# Altium footprint library 3.22-杂项.PcbLib: 985 footprints (part 16 of 64)
Each footprint in its own frame and in the unit in brackets; x right, y up, seen from the top. Pads: shape width x height; smd on the part's side, far side on the other; paste and mask are expansions set on the pad; w line width, h text height; cw(c..) or ccw(c..) is an arc to the next point about the centre after c.
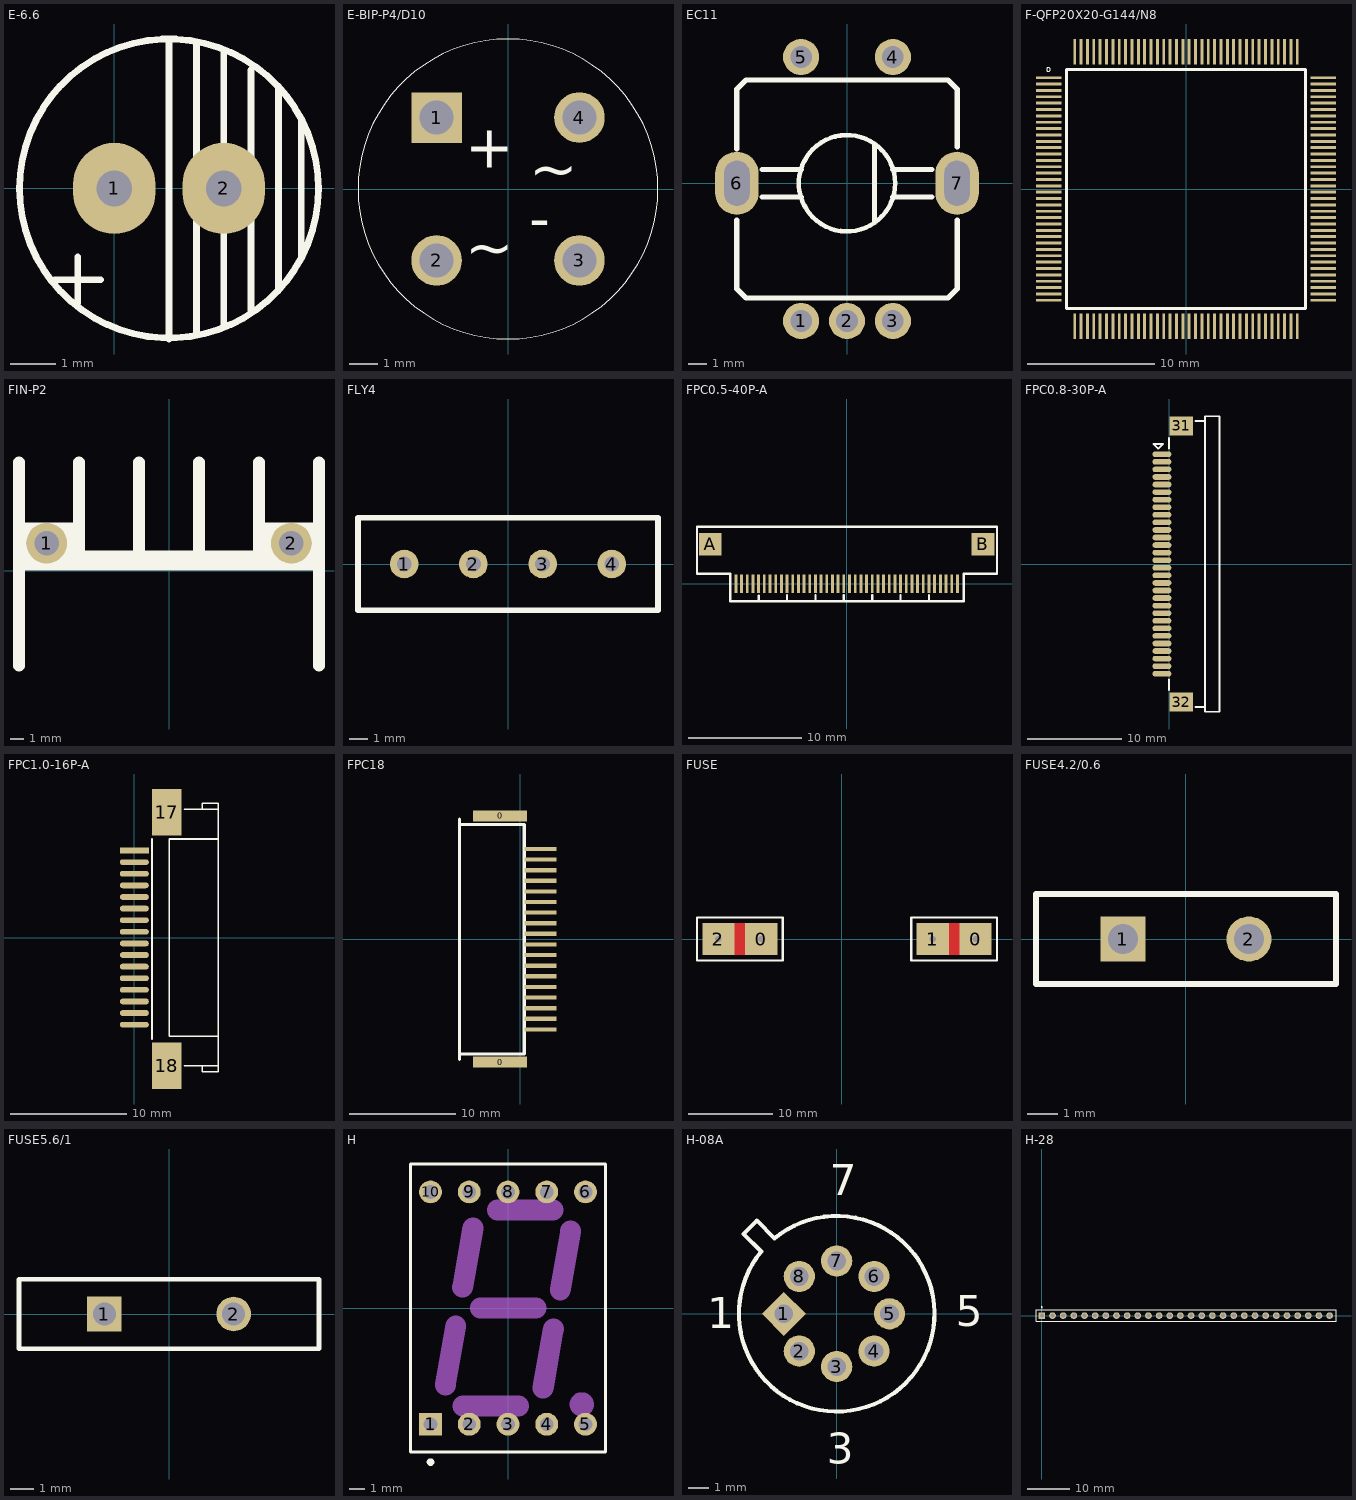
[diagram p15: the footprints below, top view; thin cyan lines are the x and y axes]

## E-6.6 [mm] "100uF/50V"
pads (2):
  oval 1.8x2 hole 0.787: 1(0,0) 2(2.4,0)
Top Overlay:
  circle w0.15: c1.2,0 r3.277
  lines w0.15: -1.3,-2 -0.3,-2 ; -0.8,-2.5 -0.8,-1.5 ; 1.2,-3.3 1.2,3.2 ; 1.8,-3.2 1.8,3.2 ; 2.4,-3 2.4,3 ; 3,-2.7 3,2.6 ; 3.6,-2.2 3.6,2.2 ; 4.1,-1.5 4.1,1.5

## E-BIP-P4/D10 [mm] "整流桥　xy=5.08"
pads (4):
  rect 1.8x1.8 hole 1.2: 1(-2.54,2.54)
  round 1.8 hole 1.2: 2(-2.54,-2.54) 3(2.54,-2.54) 4(2.54,2.54)
Top Overlay:
  circle w0.025: c0,0 r5.334
  text "~" at 0.762,0 h1.5
  text "~" at -1.524,-2.794 h1.5
  text "+" at -1.524,0.762 h1.5
  text "-" at 0.762,-1.778 h1.5

## EC11 [mm]
pads (7):
  round 2 hole 1.2: 1(-2.54,-7.62) 2(0,-7.62) 3(2.54,-7.62) 4(2.54,6.985) 5(-2.54,6.985)
  oval 2.4x3.5 hole 1.4 slot 2.5 at 90 deg: 6(-6.096,0) 7(6.096,0)
Top Overlay:
  circle w0.254: c0,0 r2.667
  lines w0.3: -6.096,-2.032 -6.096,-5.842 -5.588,-6.35 5.588,-6.35 6.096,-5.842 6.096,-2.032 ; -6.096,1.905 -6.096,5.207 -5.588,5.715 5.588,5.715 6.096,5.207 6.096,2.032 ; -4.699,-0.762 -2.54,-0.762 ; -4.699,0.762 -2.54,0.762 ; 1.524,-2.159 1.524,2.159 ; 2.54,-0.762 4.699,-0.762 ; 2.54,0.762 4.699,0.762

## F-QFP20X20-G144/N8 [mm] "dsp2407海堂的"
pads (144):
  rect 2x0.229 smd: 1(-10.795,8.75) 2(-10.795,8.25) 3(-10.795,7.75) 4(-10.795,7.25) 5(-10.795,6.75) 6(-10.795,6.25) 7(-10.795,5.75) 8(-10.795,5.25) 9(-10.795,4.75) 10(-10.795,4.25) 11(-10.795,3.75) 12(-10.795,3.25) 13(-10.795,2.75) 14(-10.795,2.25) 15(-10.795,1.75) 16(-10.795,1.25) 17(-10.795,0.75) 18(-10.795,0.25) 19(-10.795,-0.25) 20(-10.795,-0.75) 21(-10.795,-1.25) 22(-10.795,-1.75) 23(-10.795,-2.25) 24(-10.795,-2.75) 25(-10.795,-3.25) 26(-10.795,-3.75) 27(-10.795,-4.25) 28(-10.795,-4.75) 29(-10.795,-5.25) 30(-10.795,-5.75) 31(-10.795,-6.25) 32(-10.795,-6.75) 33(-10.795,-7.25) 34(-10.795,-7.75) 35(-10.795,-8.25) 36(-10.795,-8.75) 73(10.795,-8.75) 74(10.795,-8.25) 75(10.795,-7.75) 76(10.795,-7.25) 77(10.795,-6.75) 78(10.795,-6.25) 79(10.795,-5.75) 80(10.795,-5.25) 81(10.795,-4.75) 82(10.795,-4.25) 83(10.795,-3.75) 84(10.795,-3.25) 85(10.795,-2.75) 86(10.795,-2.25) 87(10.795,-1.75) 88(10.795,-1.25) 89(10.795,-0.75) 90(10.795,-0.25) 91(10.795,0.25) 92(10.795,0.75) 93(10.795,1.25) 94(10.795,1.75) 95(10.795,2.25) 96(10.795,2.75) 97(10.795,3.25) 98(10.795,3.75) 99(10.795,4.25) 100(10.795,4.75) 101(10.795,5.25) 102(10.795,5.75) 103(10.795,6.25) 104(10.795,6.75) 105(10.795,7.25) 106(10.795,7.75) 107(10.795,8.25) 108(10.795,8.75)
  rect 0.229x2 smd: 37(-8.75,-10.795) 38(-8.25,-10.795) 39(-7.75,-10.795) 40(-7.25,-10.795) 41(-6.75,-10.795) 42(-6.25,-10.795) 43(-5.75,-10.795) 44(-5.25,-10.795) 45(-4.75,-10.795) 46(-4.25,-10.795) 47(-3.75,-10.795) 48(-3.25,-10.795) 49(-2.75,-10.795) 50(-2.25,-10.795) 51(-1.75,-10.795) 52(-1.25,-10.795) 53(-0.75,-10.795) 54(-0.25,-10.795) 55(0.25,-10.795) 56(0.75,-10.795) 57(1.25,-10.795) 58(1.75,-10.795) 59(2.25,-10.795) 60(2.75,-10.795) 61(3.25,-10.795) 62(3.75,-10.795) 63(4.25,-10.795) 64(4.75,-10.795) 65(5.25,-10.795) 66(5.75,-10.795) 67(6.25,-10.795) 68(6.75,-10.795) 69(7.25,-10.795) 70(7.75,-10.795) 71(8.25,-10.795) 72(8.75,-10.795) 109(8.75,10.795) 110(8.25,10.795) 111(7.75,10.795) 112(7.25,10.795) 113(6.75,10.795) 114(6.25,10.795) 115(5.75,10.795) 116(5.25,10.795) 117(4.75,10.795) 118(4.25,10.795) 119(3.75,10.795) 120(3.25,10.795) 121(2.75,10.795) 122(2.25,10.795) 123(1.75,10.795) 124(1.25,10.795) 125(0.75,10.795) 126(0.25,10.795) 127(-0.25,10.795) 128(-0.75,10.795) 129(-1.25,10.795) 130(-1.75,10.795) 131(-2.25,10.795) 132(-2.75,10.795) 133(-3.25,10.795) 134(-3.75,10.795) 135(-4.25,10.795) 136(-4.75,10.795) 137(-5.25,10.795) 138(-5.75,10.795) 139(-6.25,10.795) 140(-6.75,10.795) 141(-7.25,10.795) 142(-7.75,10.795) 143(-8.25,10.795) 144(-8.75,10.795)
Top Overlay:
  circle w0.025: c-10.818,9.398 r0.15
  lines w0.25: -9.4,-9.4 -9.4,9.4 9.4,9.4 9.4,-9.4 -9.4,-9.4

## FIN-P2 [mm] "散热片"
height 1.9
pads (2):
  round 3 hole 1.8: 1(-9.017,2.032) 2(9.017,2.032)
Top Overlay:
  rectangle: 6.629,1.27 11.049,3.556
  rectangle: -11.049,0.889 -6.629,3.556
  lines w0.85: -11.049,-7 -11.049,8 ; -6.629,0.762 -6.629,8.001 ; -2.21,0.762 -2.21,8.001 ; 2.21,0.762 2.21,8.001 ; 6.629,0.762 6.629,8.001 ; 11.049,-7 11.049,8
  lines w1.5: -10.668,0.762 10.668,0.762

## FLY4 [mil] "整流桥4脚，KBP310"
pads (4):
  round 62 hole 32: 1(-225,0) 2(-75,0) 3(75,0) 4(225,0)
Top Overlay:
  lines w12: -325,-100 325,-100 325,100 -325,100 -325,-100

## FPC0.5-40P-A [mm]
height 1
pads (42):
  rect 0.25x1.6 smd: 1(-9.78,0.011) 2(-9.28,0.011) 3(-8.78,0.011) 4(-8.28,0.011) 5(-7.78,0.011) 6(-7.28,0.011) 7(-6.78,0.011) 8(-6.28,0.011) 9(-5.78,0.011) 10(-5.28,0.011) 11(-4.78,0.011) 12(-4.28,0.011) 13(-3.78,0.011) 14(-3.28,0.011) 15(-2.78,0.011) 16(-2.28,0.011) 17(-1.78,0.011) 18(-1.28,0.011) 19(-0.78,0.011) 20(-0.28,0.011) 21(0.22,0.011) 22(0.72,0.011) 23(1.22,0.011) 24(1.72,0.011) 25(2.22,0.011) 26(2.72,0.011) 27(3.22,0.011) 28(3.72,0.011) 29(4.22,0.011) 30(4.72,0.011) 31(5.22,0.011) 32(5.72,0.011) 33(6.22,0.011) 34(6.72,0.011) 35(7.22,0.011) 36(7.72,0.011) 37(8.22,0.011) 38(8.72,0.011) 39(9.22,0.011) 40(9.72,0.011)
  rect 2x2 smd: A(-12.029,3.5) B(11.971,3.5)
Top Overlay:
  lines w0.2: -10.287,-1.524 -10.287,0.889 -13.208,0.889 -13.208,5.036 13.208,5.036 13.208,1.27 13.208,0.889 10.287,0.889 10.287,-1.514 -10.287,-1.514 ; -7.78,-1.514 -7.78,-1.014 ; -5.28,-1.514 -5.28,-0.989 ; -2.78,-1.489 -2.78,-0.989 ; -0.28,-1.464 -0.28,-0.964 ; 2.22,-1.464 2.22,-0.964 ; 4.72,-1.464 4.72,-0.964 ; 7.22,-1.464 7.22,-0.964

## FPC0.8-30P-A [mm] "FPC"
height 1.2
pads (32):
  oval 2x0.6 smd: 1(-0.762,11.6) 2(-0.762,10.8) 3(-0.762,10) 4(-0.762,9.2) 5(-0.762,8.4) 6(-0.762,7.6) 7(-0.762,6.8) 8(-0.762,6) 9(-0.762,5.2) 10(-0.762,4.4) 11(-0.762,3.6) 12(-0.762,2.8) 13(-0.762,2) 14(-0.762,1.2) 15(-0.762,0.4) 16(-0.762,-0.4) 17(-0.762,-1.2) 18(-0.762,-2) 19(-0.762,-2.8) 20(-0.762,-3.6) 21(-0.762,-4.4) 22(-0.762,-5.2) 23(-0.762,-6) 24(-0.762,-6.8) 25(-0.762,-7.6) 26(-0.762,-8.4) 27(-0.762,-9.2) 28(-0.762,-10) 29(-0.762,-10.8) 30(-0.762,-11.6)
  rect 2.5x2 smd: 31(1.27,14.605) 32(1.27,-14.605)
Top Overlay:
  lines w0.2: 0,-13.335 0,-12.192 ; 0,12.192 0,13.335 ; 2.794,-15.113 3.81,-15.113 ; 2.794,15.113 3.81,15.113 ; 3.81,-15.113 3.81,-15.621 5.334,-15.621 5.334,15.621 3.81,15.621 3.81,15.113 ; 3.81,-15.113 3.81,15.113 ; -1.651,12.7 -1.524,12.7 -0.635,12.7 -1.143,12.192 -1.651,12.7

## FPC1.0-16P-A [mm] "FPC"
height 1.2
pads (18):
  rect 2.5x0.5 smd: 1(0,7.493)
  oval 2.5x0.5 smd: 2(0,6.493) 3(0,5.493) 4(0,4.493) 5(0,3.493) 6(0,2.493) 7(0,1.493) 8(0,0.493) 9(0,-0.507) 10(0,-1.507) 11(0,-2.507) 12(0,-3.507) 13(0,-4.507) 14(0,-5.507) 15(0,-6.507) 16(0,-7.507)
  rect 2.5x4 smd: 17(2.794,10.795) 18(2.794,-11.049)
Top Overlay:
  lines w0.15: 1.524,-8.763 1.524,8.509 ; 4.318,-11.049 7.224,-11.049 ; 4.318,11.049 7.224,11.049 ; 5.842,11.049 5.842,11.557 7.224,11.557 7.224,11.049 ; 6.096,-11.049 5.842,-11.049 5.842,-11.557 7.224,-11.557 7.224,-11.049 ; 7.224,-8.507 3,-8.507 3,8.493 7.224,8.493 ; 7.224,-11.049 7.224,11.049

## FPC18 [mm] "18芯液晶FPC插座，1mm间距"
pads (20):
  rect 5.08x1.016 smd: 0(-1.905,-11.582) 0(-1.905,11.582)
  rect 3x0.4 smd: 1(1.905,8.484) 2(1.905,7.484) 3(1.905,6.484) 4(1.905,5.484) 5(1.905,4.484) 6(1.905,3.484) 7(1.905,2.484) 8(1.905,1.484) 9(1.905,0.484) 10(1.905,-0.516) 11(1.905,-1.516) 12(1.905,-2.516) 13(1.905,-3.516) 14(1.905,-4.516) 15(1.905,-5.516) 16(1.905,-6.516) 17(1.905,-7.516) 18(1.905,-8.516)
Top Overlay:
  lines w0.3: -5.715,-11.328 -5.715,11.278 ; -5.715,10.77 0.381,10.77 0.381,-10.82 -5.595,-10.82

## FUSE [mil]
pads (4):
  rect 150x150 hole 30: 0(-375,0) 0(625,0) 1(425,0) 2(-575,0)
Top Layer:
  rectangle: -525,-75 -425,75
  rectangle: 475,-75 575,75
Bottom Layer:
  rectangle: -525,-75 -425,75
  rectangle: 475,-75 575,75
Top Overlay:
  lines w10: -675,-100 -275,-100 -275,100 -675,100 -675,-100 ; 325,-100 725,-100 725,100 325,100 325,-100

## FUSE4.2/0.6 [mm] "扁圆形2针保险管(60VX075),60V75mA，针间距4.2mm,直径0.6mm，长10mm宽3mm"
height 15
pads (2):
  rect 1.5x1.5 hole 1: 1(-2.1,0)
  round 1.5 hole 1: 2(2.1,0)
Top Overlay:
  lines w0.2: -5,-1.5 5,-1.5 5,1.5 -5,1.5 -5,-1.5

## FUSE5.6/1 [mm] "2针方形保险管，30V1A，GBU300，5.6mm间距，1mm直径,3mm宽"
height 15
pads (2):
  rect 1.5x1.5 hole 1: 1(-2.8,0)
  round 1.5 hole 1: 2(2.8,0)
Top Overlay:
  lines w0.2: -6.5,-1.5 6.5,-1.5 6.5,1.5 -6.5,1.5 -6.5,-1.5

## H [mm] "LED, 7-Segment Display, 14.2 mm, RHD; 10 Leads; Row Space 15.24 mm; Pitch 2.54 mm"
height 8.25
pads (10):
  rect 1.5x1.5 hole 0.9: 1(-5.08,-7.62)
  round 1.5 hole 0.9: 2(-2.54,-7.62) 3(0,-7.62) 4(2.54,-7.62) 5(5.08,-7.62) 6(5.08,7.62) 7(2.54,7.62) 8(0,7.62) 9(-2.54,7.62) 10(-5.08,7.62)
Top Overlay:
  circle w0.25: c-5.08,-10.1 r0.125
  lines w0.2: -6.4,-9.45 6.4,-9.45 6.4,9.45 -6.4,9.45 -6.4,-9.45
Mechanical 1:
  circle w1: c4.842,-6.316 r0.296
  lines w1.37: -4.108,-5.054 -3.425,-1.17 ; -2.974,1.368 -2.293,5.255 ; -2.958,-6.429 0.692,-6.426 ; -1.821,0 1.828,0 ; -0.689,6.425 2.96,6.425 ; 2.295,-5.256 2.98,-1.371 ; 3.427,1.169 4.11,5.058

## H-08A [mm] "Can; 8 Leads; Pin Circle Dia. 5.08 mm (TO-99)"
height 5.72
pads (8):
  rect 1.5x1.5 hole 0.9 rot 45: 1(-2.54,0)
  round 1.5 hole 0.9: 2(-1.796,-1.796) 3(0,-2.54) 4(1.796,-1.796) 5(2.54,0) 6(1.796,1.796) 7(0,2.54) 8(-1.796,1.796)
Top Overlay:
  lines w0.2: -4.475,3.838 -3.838,4.475 -2.99,3.626 cw(c0,0) -3.626,2.99 -4.475,3.838
  text "1" at -6.22,-0.696 h1.5
  text "3" at -0.469,-7.22 h1.5
  text "5" at 5.712,-0.589 h1.5
  text "7" at -0.332,5.7 h1.5

## H-28 [mm]
pads (28):
  rect 1.6x1.6 hole 0.99: 1(0,0)
  round 1.6 hole 0.99: 2(2.54,0) 3(5.08,0) 4(7.62,0) 5(10.16,0) 6(12.7,0) 7(15.24,0) 8(17.78,0) 9(20.32,0) 10(22.86,0) 11(25.4,0) 12(27.94,0) 13(30.48,0) 14(33.02,0) 15(35.56,0) 16(38.1,0) 17(40.64,0) 18(43.18,0) 19(45.72,0) 20(48.26,0) 21(50.8,0) 22(53.34,0) 23(55.88,0) 24(58.42,0) 25(60.96,0) 26(63.5,0) 27(66.04,0) 28(68.58,0)
Top Overlay:
  circle w0.25: c0,2.05 r0.125
  lines w0.2: -1.4,-1.4 70.104,-1.4 70.104,1.4 -1.4,1.4 -1.4,-1.4